# Altium footprint library UWRT_Footprint_Library_2020.PcbLib: 376 footprints (part 4 of 24)
Each footprint in its own frame and in the unit in brackets; x right, y up, seen from the top. Pads: shape width x height; smd on the part's side, far side on the other; paste and mask are expansions set on the pad; w line width, h text height; cw(c..) or ccw(c..) is an arc to the next point about the centre after c.
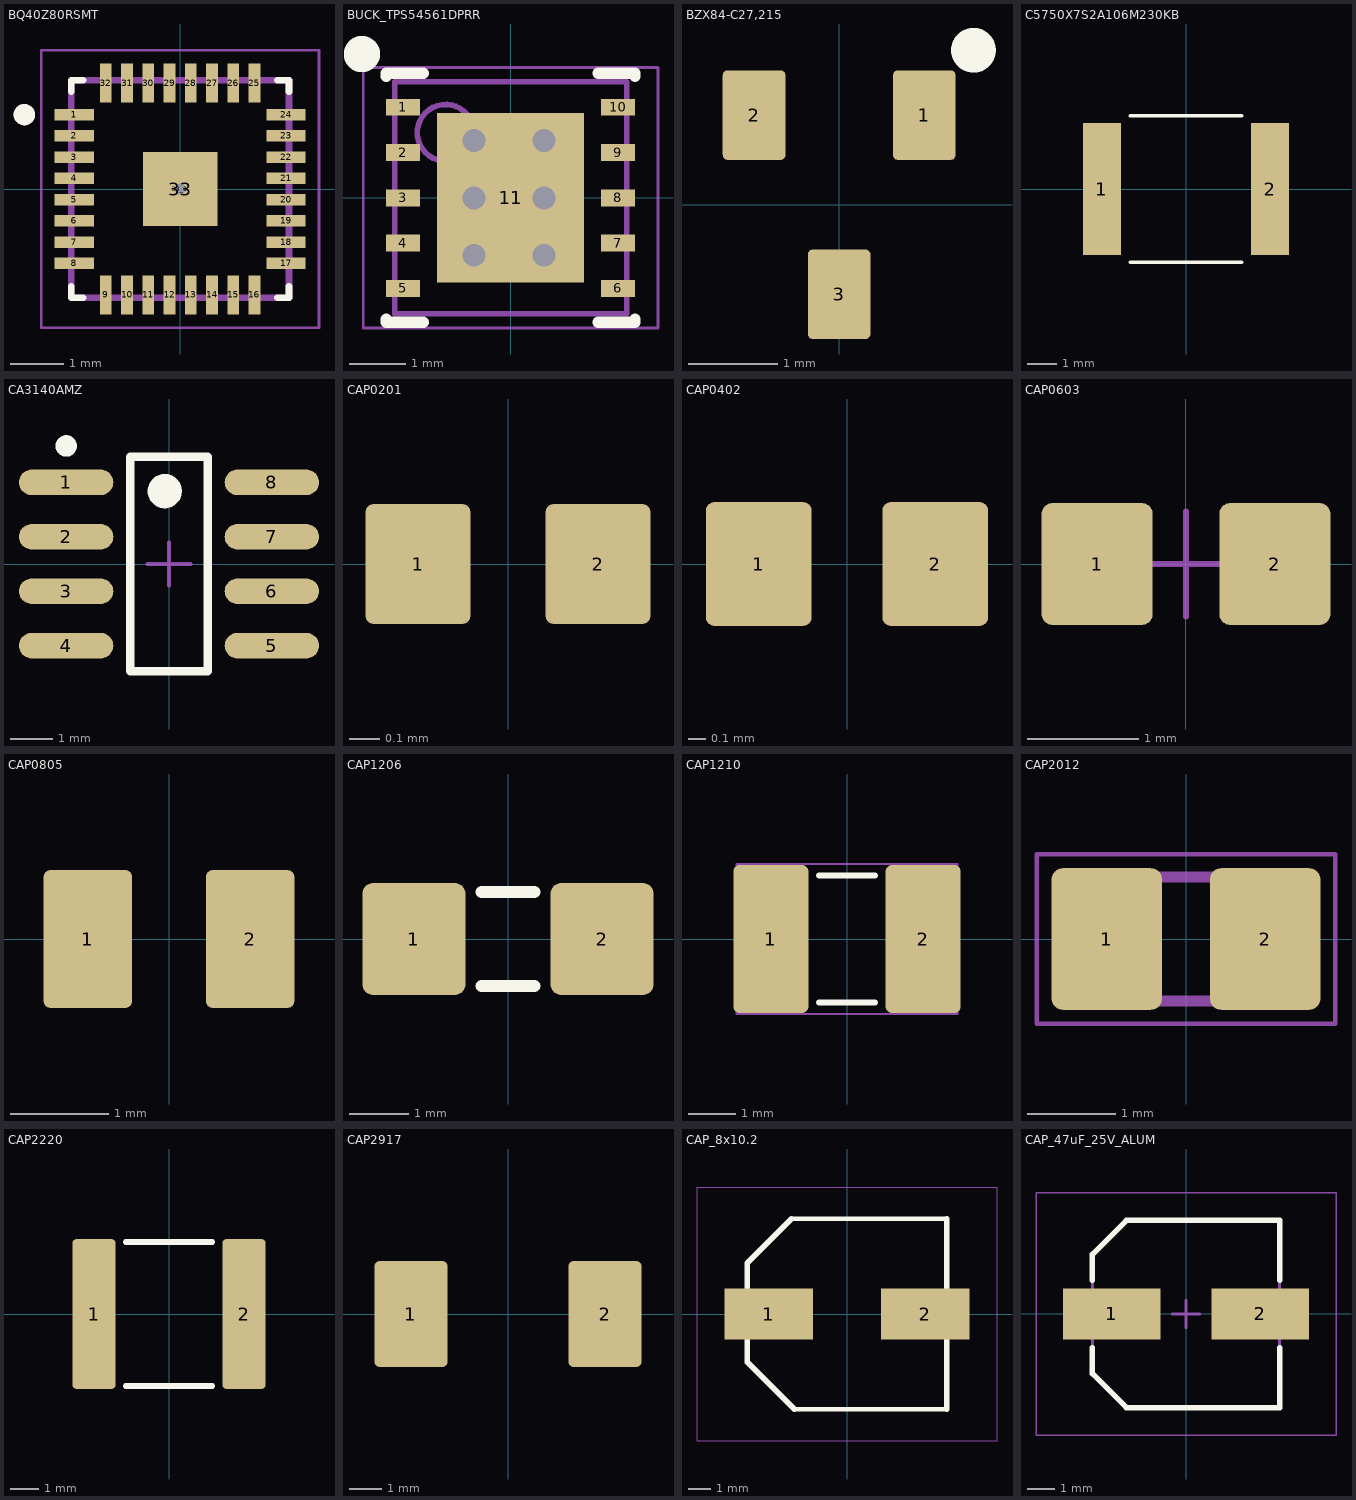
[diagram p3: the footprints below, top view; thin cyan lines are the x and y axes]

## BQ40Z80RSMT [mm] "QFN40P400X400X100-33N_BQ40Z80RSMT(Primary)"
pads (34):
  rect 0.74x0.22 smd: 1(-1.995,1.4) 2(-1.995,1) 3(-1.995,0.6) 4(-1.995,0.2) 5(-1.995,-0.2) 6(-1.995,-0.6) 7(-1.995,-1) 8(-1.995,-1.4) 17(1.995,-1.4) 18(1.995,-1) 19(1.995,-0.6) 20(1.995,-0.2) 21(1.995,0.2) 22(1.995,0.6) 23(1.995,1) 24(1.995,1.4)
  rect 0.22x0.74 smd: 9(-1.4,-1.995) 10(-1,-1.995) 11(-0.6,-1.995) 12(-0.2,-1.995) 13(0.2,-1.995) 14(0.6,-1.995) 15(1,-1.995) 16(1.4,-1.995) 25(1.4,1.995) 26(1,1.995) 27(0.6,1.995) 28(0.2,1.995) 29(-0.2,1.995) 30(-0.6,1.995) 31(-1,1.995) 32(-1.4,1.995)
  rect 1.4x1.4 smd: 33(0,0)
  round 0.4 hole 0.2: 33_1(0,0)
Top Overlay:
  circle w0.2: c-2.935,1.4 r0.1
  lines w0.127: -2.05,-1.83 -2.05,-2.05 -1.83,-2.05 ; -2.05,1.83 -2.05,2.05 -1.83,2.05 ; 1.83,-2.05 2.05,-2.05 2.05,-1.83 ; 1.83,2.05 2.05,2.05 2.05,1.83
Top Paste:
  region: -0.443,0.443 0.443,0.443 0.443,-0.443 -0.443,-0.443
Mechanical 4:
  circle w0.2: c-2.935,1.4 r0.1
  circle w0.2: c-2.935,1.4 r0.1
  lines w0.127: -2.05,-2.05 2.05,-2.05 ; -2.05,-2.05 -2.05,2.05 ; -2.05,-2.05 2.05,-2.05 ; -2.05,-2.05 -2.05,2.05 ; -2.05,2.05 2.05,2.05 ; -2.05,2.05 2.05,2.05 ; 2.05,-2.05 2.05,2.05 ; 2.05,-2.05 2.05,2.05
Mechanical 16:
  lines w0.05: -2.615,-2.615 2.615,-2.615 2.615,2.615 -2.615,2.615 -2.615,-2.615
3D body "RSM0032A.stp": height 1, standoff 0, extent -2,-2 2,2

## BUCK_TPS54561DPRR [mm] "Buck Switching Regulator IC Positive Adjustable 0.8V 1 Output 5A 10-WDFN Exposed Pad"
height 0.8
pads (11):
  rect 0.6x0.3 smd: 1(-1.9,1.6) 2(-1.9,0.8) 3(-1.9,0) 4(-1.9,-0.8) 5(-1.9,-1.6) 6(1.9,-1.6) 7(1.9,-0.8) 8(1.9,0) 9(1.9,0.8) 10(1.9,1.6)
  rect 2.6x3 smd paste-1.245: 11(0,0)
via 0.592,-1.016 diameter 0.711 hole 0.406
via -0.65,-1.016 diameter 0.711 hole 0.406
via 0.592,0 diameter 0.711 hole 0.406
via -0.65,0 diameter 0.711 hole 0.406
via 0.592,1.016 diameter 0.711 hole 0.406
via -0.65,1.016 diameter 0.711 hole 0.406
Top Overlay:
  circle w0.5: c-2.628,2.54 r0.07
  lines w0.2: -2.2,-2.15 -2.2,-2.2 -1.545,-2.2 ; -2.2,2.15 -2.2,2.2 -1.545,2.2 ; 1.545,-2.2 2.2,-2.2 2.2,-2.15 ; 1.545,2.2 2.2,2.2 2.2,2.15
Top Paste:
  rectangle: -1.15,0.1 -0.1,1.4
  rectangle: -1.15,-1.4 -0.1,-0.1
  rectangle: 0.1,0.1 1.15,1.4
  rectangle: 0.1,-1.4 1.15,-0.1
Mechanical 13:
  circle w0.1: c-1.15,1.15 r0.5
  lines w0.1: -2.05,-2.05 -2.05,2.05 2.05,2.05 2.05,-2.05 -2.05,-2.05
Mechanical 15:
  lines w0.05: -2.605,-2.3 -2.605,2.3 2.605,2.3 2.605,-2.3 -2.605,-2.3
  lines w0.1: -0.5,0 0.5,0 ; 0,-0.5 0,0.5
3D body: height 0.8, standoff 0, extent -2.05,-2.05 2.05,2.05

## BZX84-C27,215 [mm] "DIODE ZENER 27V 250MW TO236AB"
pads (3):
  rrect15% 0.7x1 smd mask+0.1: 1(0.95,1) 2(-0.95,1) 3(0,-1)
Top Overlay:
  circle w0.25: c1.5,1.725 r0.125
3D body "CircuitWorks-SOT-23.step": height 1.11, standoff 0.01, extent -1.5,-1.25 1.5,1.25

## C5750X7S2A106M230KB [mm]
pads (2):
  rect 1.3x4.5 smd mask+0: 1(-2.875,0) 2(2.875,0)
Top Overlay:
  lines w0.127: -1.905,-2.5 1.905,-2.5 ; -1.905,2.5 1.905,2.5
Top Solder:
  region: 3.525,-2.25 2.225,-2.25 2.225,2.25 3.525,2.25
  region: -2.225,-2.25 -3.525,-2.25 -3.525,2.25 -2.225,2.25
3D body "CAP_5750_TDK-L.step": height 1.24, standoff 0, extent -3.048,-2.705 3.048,2.705

## CA3140AMZ [mm]
pads (8):
  oval 2.2x0.6 smd: 1(-2.4,1.905) 2(-2.4,0.635) 3(-2.4,-0.635) 4(-2.4,-1.905) 5(2.4,-1.905) 6(2.4,-0.635) 7(2.4,0.635) 8(2.4,1.905)
Top Overlay:
  circle w0.4: c-0.1,1.7 r0.2
  circle w0.25: c-2.4,2.755 r0.125
  lines w0.2: -0.9,-2.5 0.9,-2.5 0.9,2.5 -0.9,2.5 -0.9,-2.5
Mechanical 15:
  lines w0.1: -0.5,0 0.5,0 ; 0,-0.5 0,0.5
3D body: height 1.75, standoff 0.1, extent -2,-2.5 2,2.5

## CAP0201 [mm] "Chip Capacitor, Body 0.6x0.3mm, Height 0.25mm, IPC Medium Density"
pads (2):
  rrect15% 0.35x0.4 smd: 1(-0.3,0) 2(0.3,0)
3D body "CAP0201.SLDPRT": height 0.3, standoff 0, extent -0.3,-0.15 0.3,0.15

## CAP0402 [mm] "Chip Capacitor, Body 1x0.5mm, Height 0.35mm, IPC Medium Density"
pads (2):
  rrect15% 0.6x0.7 smd: 1(-0.5,0) 2(0.5,0)
3D body "CAP0402.stp": height 0.54, standoff -0.01, extent -0.525,-0.275 0.525,0.275

## CAP0603 [mm]
height 0.55
pads (2):
  rrect20% 1x1.1 smd: 1(-0.8,0) 2(0.8,0)
Mechanical 13:
  lines w0.1: -0.875,-0.475 -0.875,0.475 ; 0.875,-0.475 0.875,0.475
Mechanical 15:
  lines w0.05: -0.475,0 0.475,0 ; 0,-0.475 0,0.475
3D body: height 0.55, standoff 0, extent 0.525,-0.475 0.875,0.475
3D body: height 0.55, standoff 0, extent -0.875,-0.475 -0.525,0.475
3D body "c0603c101j1gactu.stp": height 0.87, standoff 0, extent -0.875,-0.475 0.875,0.475

## CAP0805 [mm] "Chip Capacitor, Body 2.0x1.2mm, Height 0.45mm, IPC Medium Density"
pads (2):
  rrect15% 0.9x1.4 smd: 1(-0.825,0) 2(0.825,0)
3D body "CAP0805.stp": height 1.39, standoff -0.01, extent -1.1,-0.725 1.1,0.725

## CAP1206 [mm] "Chip Capacitor, Body 3.2x1.6mm, Height 0.55mm, IPC Medium Density"
height 0.55
pads (2):
  rrect20% 1.75x1.9 smd: 1(-1.6,0) 2(1.6,0)
Top Overlay:
  lines w0.2: -0.45,-0.8 0.45,-0.8 ; -0.45,0.8 0.45,0.8
3D body "1206.stp": height 0.88, standoff 0, extent -1.7,-0.9 1.7,0.9

## CAP1210 [mm]
pads (2):
  rrect15% 1.6x3.15 smd: 1(-1.625,0) 2(1.625,0)
Top Overlay:
  lines w0.127: -0.6,-1.35 0.6,-1.35 ; -0.6,1.35 0.6,1.35
Mechanical 15:
  lines w0.05: -2.355,-1.6 2.355,-1.6 2.355,1.6 -2.355,1.6 -2.355,-1.6
3D body "c1210c106k3pactu.stp": height 2.1, standoff 0, extent -1.7,-1.35 1.7,1.35

## CAP2012 [mm]
pads (2):
  rrect20% 1.25x1.6 smd: 1(-0.895,0) 2(0.895,0)
Mechanical 4:
  lines w0.127: -1.07,-0.7 1.07,-0.7 ; -1.07,-0.7 -1.07,0.7 ; -1.07,-0.7 1.07,-0.7 ; -1.07,-0.7 -1.07,0.7 ; -1.07,0.7 1.07,0.7 ; -1.07,0.7 1.07,0.7 ; 1.07,-0.7 1.07,0.7 ; 1.07,-0.7 1.07,0.7
Mechanical 15:
  lines w0.05: -1.685,-0.96 1.685,-0.96 1.685,0.96 -1.685,0.96 -1.685,-0.96
3D body "c0805c100jdgactu.stp": height 1.41, standoff 0.01, extent -1.1,-0.7 1.1,0.75

## CAP2220 [mm]
height 0.55
pads (2):
  rrect20% 1.5x5.2 smd: 1(-2.6,0) 2(2.6,0)
Top Overlay:
  lines w0.2: -1.5,-2.5 1.5,-2.5 ; -1.5,2.5 1.5,2.5
3D body "CAP2220.step": height 2.4, standoff 0, extent -2.921,-2.5 2.921,2.5

## CAP2917 [mm]
pads (2):
  rrect15% 2.25x3.25 smd: 1(-2.975,0) 2(2.975,0)
3D body "CAP2917.stp": height 2.8, standoff -0.1, extent -3.775,-2.175 3.725,2.125

## CAP_8x10.2 [mm]
pads (2):
  rect 4x2.3 smd: 1(-3.55,0) 2(3.55,0)
Top Overlay:
  lines w0.2: -2.515,4.318 4.521,4.318 ; -2.388,-4.318 4.521,-4.318
  lines w0.254: -2.515,4.318 -4.521,2.311 -4.521,-2.184 -2.388,-4.318 ; 4.521,-4.318 4.521,4.318
Mechanical 13:
  lines w0.1: -4.521,-2.184 -2.388,-4.318 4.521,-4.318 4.521,4.318 -2.515,4.318 -4.521,2.311 -4.521,-2.184
Mechanical 15:
  lines w0.05: -6.8,-5.75 -6.8,5.75 6.8,5.75 6.8,-5.75 -6.8,-5.75
3D body "User Library-SMD 8x10.step": height -0.4, standoff -8.9, extent -4.85,-4.15 4.85,4.15

## CAP_47uF_25V_ALUM [mm] "Aluminum Electrolytic Capacitor, Body 6.60x6.60x6.00mm, IPC Low Density"
height 6
pads (2):
  rect 3.55x1.85 smd: 1(-2.7,0) 2(2.7,0)
Top Overlay:
  lines w0.2: -3.4,-1.225 -3.4,-2.163 -2.163,-3.4 3.4,-3.4 3.4,-1.225 ; -3.4,1.225 -3.4,2.163 -2.163,3.4 3.4,3.4 3.4,1.225
Mechanical 13:
  lines w0.1: -3.4,-2.163 -3.4,2.163 -2.163,3.4 3.4,3.4 3.4,-3.4 -2.163,-3.4 -3.4,-2.163
Mechanical 15:
  lines w0.05: -5.45,-4.4 5.45,-4.4 5.45,4.4 -5.45,4.4 -5.45,-4.4
  lines w0.1: -0.5,0 0.5,0 ; 0,-0.5 0,0.5
3D body: height 6, standoff 0, extent -3.4,-3.4 3.4,3.4
3D body: height 2, standoff 0, extent -3.4,-3.4 3.4,3.4